# Altium footprint library Connectors.PcbLib: 66 footprints (part 5 of 5)
Each footprint in its own frame and in the unit in brackets; x right, y up, seen from the top. Pads: shape width x height; smd on the part's side, far side on the other; paste and mask are expansions set on the pad; w line width, h text height; cw(c..) or ccw(c..) is an arc to the next point about the centre after c.
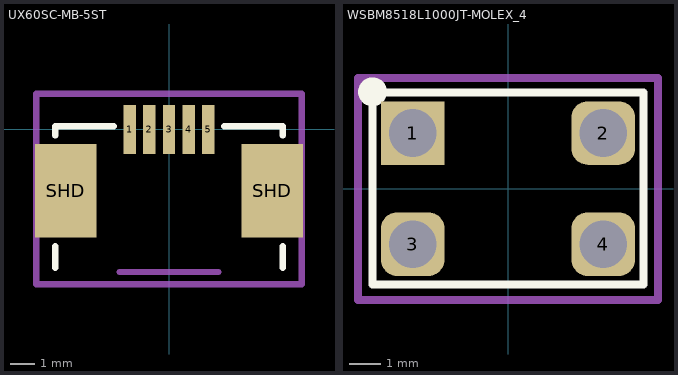
[diagram p4: the footprints below, top view; thin cyan lines are the x and y axes]

## UX60SC-MB-5ST [mm] "USB Mini-B Recepticle"
pads (7):
  rect 0.5x2 smd: 1(-1.6,0) 2(-0.8,0) 3(0,0) 4(0.8,0) 5(1.6,0)
  rect 2.5x3.8 smd: SHD(-4.2,-2.5) SHD(4.2,-2.5)
Top Overlay:
  lines w0.254: -4.625,-5.625 -4.625,-4.75 ; -4.625,-0.25 -4.625,0.125 -2.25,0.125 ; 2.25,0.125 4.625,0.125 4.625,-0.25 ; 4.625,-5.625 4.625,-4.75
Mechanical 1:
  lines w0.254: -2,-5.8 2,-5.8
Mechanical 15:
  lines w0.254: -5.4,-6.3 -5.4,1.45 5.4,1.45 5.4,-6.3 -5.4,-6.3
3D body "UX60SC-MB-5ST.stp": height 3.95, standoff 0, extent -4.9,-6.605 4.9,0.395

## WSBM8518L1000JT-MOLEX_4 [mm] "4 pins of molex type MX150 male to female connector"
pads (4):
  rect 2x2 hole 1.5: 1(-3,1.75)
  rrect50% 2x2 hole 1.5: 2(3,1.75) 3(-3,-1.75) 4(3,-1.75)
Top Overlay:
  circle w0.6: c-4.267,3.048 r0.154
  lines w0.254: -4.27,-3.02 -4.27,3.02 4.27,3.02 4.27,-3.02 -4.27,-3.02
Mechanical 15:
  lines w0.254: -4.724,-3.505 4.724,-3.505 4.724,3.48 -4.724,3.48 -4.724,-3.505